# Altium footprint library HDR2.54.PcbLib: 242 footprints (part 13 of 16)
Each footprint in its own frame and in the unit in brackets; x right, y up, seen from the top. Pads: shape width x height; smd on the part's side, far side on the other; paste and mask are expansions set on the pad; w line width, h text height; cw(c..) or ccw(c..) is an arc to the next point about the centre after c.
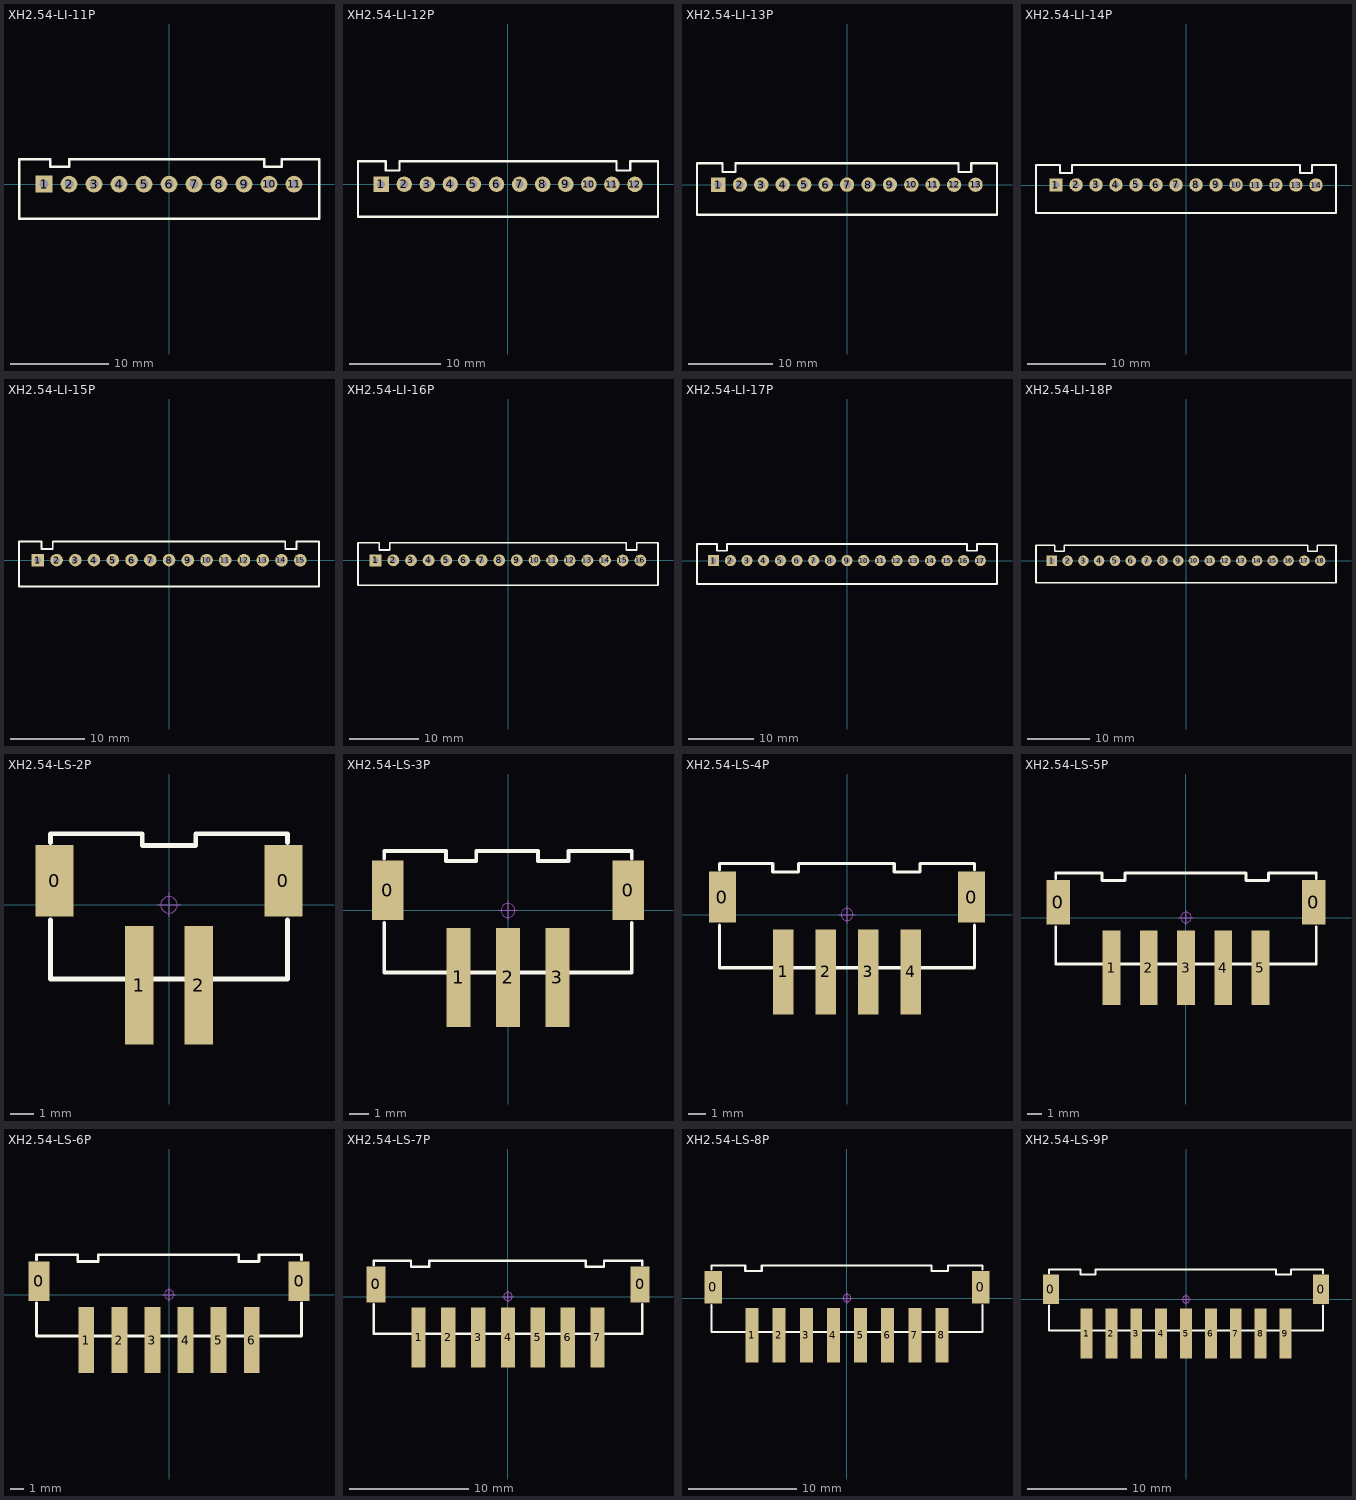
[diagram p12: the footprints below, top view; thin cyan lines are the x and y axes]

## XH2.54-LI-11P [mm] "�Ӳ����11P"
pads (11):
  rect 1.7x1.7 hole 0.9: 1(-12.7,0)
  round 1.7 hole 0.9: 2(-10.16,0) 3(-7.62,0) 4(-5.08,0) 5(-2.54,0) 6(0,0) 7(2.54,0) 8(5.08,0) 9(7.62,0) 10(10.16,0) 11(12.7,0)
Top Overlay:
  lines w0.254: -15.24,-3.5 -15.24,2.5 -12.065,2.5 -12.065,1.75 -10.16,1.75 -10.16,2.5 9.652,2.5 9.652,1.75 11.43,1.75 11.43,2.5 15.24,2.5 15.24,-3.5 -15.24,-3.5
3D body "XH2.54-11P.STEP": height 7.03, standoff -3.37, extent -15.2,-3.3 15.2,2.4

## XH2.54-LI-12P [mm] "�Ӳ����12P"
pads (12):
  rect 1.7x1.7 hole 0.9: 1(-13.97,-0.009)
  round 1.7 hole 0.9: 2(-11.417,0.003) 3(-8.877,0.003) 4(-6.35,0.009) 5(-3.797,0.003) 6(-1.257,0.003) 7(1.283,0.003) 8(3.823,0.003) 9(6.363,0.003) 10(8.903,0.003) 11(11.43,-0.009) 12(13.97,-0.009)
Top Overlay:
  lines w0.254: -16.506,-3.565 -16.506,-2.025 -16.506,2.531 -13.462,2.531 -13.462,1.515 -11.938,1.515 -11.938,2.531 11.938,2.531 11.938,1.515 13.462,1.515 13.462,2.531 16.51,2.531 16.51,-3.565 -16.506,-3.565
3D body "XH2.54-12P.STEP": height 7.05, standoff -2.45, extent -16.47,-3.309 16.47,2.391

## XH2.54-LI-13P [mm] "�Ӳ����13P"
pads (13):
  rect 1.7x1.7 hole 0.9: 1(-15.244,0)
  round 1.7 hole 0.9: 2(-12.692,0.013) 3(-10.152,0.013) 4(-7.624,0.019) 5(-5.072,0.013) 6(-2.532,0.013) 7(0.008,0.013) 8(2.548,0.013) 9(5.088,0.013) 10(7.628,0.013) 11(10.156,0) 12(12.696,0) 13(15.24,0)
Top Overlay:
  lines w0.254: -17.78,-3.556 -17.78,-2.016 -17.78,2.54 -14.736,2.54 -14.736,1.524 -13.212,1.524 -13.212,2.54 13.208,2.54 13.208,1.524 14.732,1.524 14.732,2.54 17.78,2.54 17.78,-3.556 -17.78,-3.556
3D body "XH2.54-13P.STEP": height 7.05, standoff -2.45, extent -17.74,-3.3 17.74,2.4

## XH2.54-LI-14P [mm] "�Ӳ����14P"
pads (14):
  rect 1.7x1.7 hole 0.9: 1(-16.514,0)
  round 1.7 hole 0.9: 2(-13.962,0.013) 3(-11.422,0.013) 4(-8.894,0.019) 5(-6.342,0.013) 6(-3.802,0.013) 7(-1.262,0.013) 8(1.278,0.013) 9(3.818,0.013) 10(6.358,0.013) 11(8.886,0) 12(11.426,0) 13(13.97,0) 14(16.51,0)
Top Overlay:
  lines w0.254: -19.05,-3.556 19.05,-3.556 19.05,2.54 16.002,2.54 16.002,1.524 14.478,1.524 14.478,2.54 -14.482,2.54 -14.482,1.524 -16.006,1.524 -16.006,2.54 -19.05,2.54 -19.05,-2.016 -19.05,-3.556
3D body "XH2.54-14P.STEP": height 7.05, standoff -2.45, extent -19.01,-3.3 19.01,2.4

## XH2.54-LI-15P [mm] "�Ӳ����15P"
pads (15):
  rect 1.7x1.7 hole 0.9: 1(-17.793,-0.013)
  round 1.7 hole 0.9: 2(-15.24,0) 3(-12.7,0) 4(-10.173,0.006) 5(-7.62,0) 6(-5.08,0) 7(-2.54,0) 8(0,0) 9(2.54,0) 10(5.08,0) 11(7.607,-0.013) 12(10.147,-0.013) 13(12.692,-0.013) 14(15.232,-0.013) 15(17.772,-0.013)
Top Overlay:
  lines w0.254: -20.328,-3.569 -20.328,-2.028 -20.328,2.527 -17.285,2.527 -17.285,1.511 -15.761,1.511 -15.761,2.527 15.74,2.527 15.74,1.511 17.264,1.511 17.264,2.527 20.312,2.527 20.312,-3.569 -20.328,-3.569
3D body "XH2.54-15P.STEP": height 7.05, standoff -2.45, extent -20.293,-3.313 20.267,2.387

## XH2.54-LI-16P [mm] "�Ӳ����16P"
pads (16):
  rect 1.7x1.7 hole 0.9: 1(-19.054,0)
  round 1.7 hole 0.9: 2(-16.502,0.013) 3(-13.962,0.013) 4(-11.434,0.019) 5(-8.882,0.013) 6(-6.342,0.013) 7(-3.802,0.013) 8(-1.262,0.013) 9(1.278,0.013) 10(3.818,0.013) 11(6.346,0) 12(8.886,0) 13(11.43,0) 14(13.97,0) 15(16.51,0) 16(19.05,0)
Top Overlay:
  lines w0.254: -21.59,-3.556 -21.59,-2.016 -21.59,2.54 -18.546,2.54 -18.546,1.524 -17.022,1.524 -17.022,2.54 17.018,2.54 17.018,1.524 18.542,1.524 18.542,2.54 21.59,2.54 21.59,-3.556 -21.59,-3.556
3D body "XH2.54-16P.STEP": height 7.05, standoff -2.45, extent -21.55,-3.3 21.55,2.4

## XH2.54-LI-17P [mm] "�Ӳ����17P"
pads (17):
  rect 1.7x1.7 hole 0.9: 1(-20.333,-0.013)
  round 1.7 hole 0.9: 2(-17.78,0) 3(-15.24,0) 4(-12.713,0.006) 5(-10.16,0) 6(-7.62,0) 7(-5.08,0) 8(-2.54,0) 9(0,0) 10(2.54,0) 11(5.067,-0.013) 12(7.607,-0.013) 13(10.152,-0.013) 14(12.692,-0.013) 15(15.232,-0.013) 16(17.772,-0.013) 17(20.312,-0.013)
Top Overlay:
  lines w0.254: -22.868,-3.569 22.852,-3.569 22.852,2.527 19.804,2.527 19.804,1.511 18.28,1.511 18.28,2.527 -18.301,2.527 -18.301,1.511 -19.825,1.511 -19.825,2.527 -22.868,2.527 -22.868,-2.028 -22.868,-3.569
3D body "XH2.54-17P.STEP": height 7.05, standoff -2.45, extent -22.82,-3.3 22.82,2.4

## XH2.54-LI-18P [mm] "�Ӳ����18P  �Ա�ID:�ƾ���ʯ   ������ַ:https://shop463601444.taobao.com"
pads (18):
  rect 1.7x1.7 hole 0.9: 1(-21.594,0)
  round 1.7 hole 0.9: 2(-19.042,0.013) 3(-16.502,0.013) 4(-13.974,0.019) 5(-11.422,0.013) 6(-8.882,0.013) 7(-6.342,0.013) 8(-3.802,0.013) 9(-1.262,0.013) 10(1.278,0.013) 11(3.806,0) 12(6.346,0) 13(8.89,0) 14(11.43,0) 15(13.97,0) 16(16.51,0) 17(19.05,0) 18(21.59,0)
Top Overlay:
  lines w0.254: -24.13,-3.556 24.13,-3.556 24.13,2.54 21.082,2.54 21.082,1.524 19.558,1.524 19.558,2.54 -19.562,2.54 -19.562,1.524 -21.086,1.524 -21.086,2.54 -24.13,2.54 -24.13,-2.016 -24.13,-3.556
3D body "XH2.54-18P.STEP": height 7.05, standoff -2.45, extent -24.09,-3.3 24.09,2.4

## XH2.54-LS-2P [mm] "����10mm�����6mm���ߣ�8.3mm    �Ա�ID:�ƾ���ʯ   ������ַ:https://shop463601444.taobao.com"
pads (4):
  rect 1.6x3 smd: 0(-4.826,1.016) 0(4.826,1.016)
  rect 1.2x5 smd: 1(-1.25,-3.383) 2(1.25,-3.383)
Top Overlay:
  lines w0.2: -5,-0.625 -5,-3.125 5,-3.125 5,-0.625 ; 5,2.625 5,3 1.125,3 1.125,2.5 -1.125,2.5 -1.125,3 -5,3 -5,2.625 ; -5,2.625 -5,2.625
Mechanical 15:
  circle w0.05: c0,0 r0.35
  lines w0.05: -0.5,0 0.5,0 ; 0,-0.5 0,0.5
3D body "XH2.54-LS-2P.STEP": height 8, standoff 0, extent -5,-6 5,3

## XH2.54-LS-3P [mm] "����12.5mm�����6mm���ߣ�8.3mm   �Ա�ID:�ƾ���ʯ   ������ַ:https://shop463601444.taobao.com"
pads (5):
  rect 1.6x3 smd: 0(-6.076,1.016) 0(6.076,1.016)
  rect 1.2x5 smd: 1(-2.5,-3.383) 2(0,-3.383) 3(2.5,-3.383)
Top Overlay:
  lines w0.2: -6.25,-0.625 -6.25,-3.125 6.25,-3.125 6.25,-0.625 ; -6.25,2.625 -6.25,3 -3.128,3 -3.128,2.5 -1.604,2.5 -1.604,3 1.524,3 1.524,2.5 3.048,2.5 3.048,3 6.25,3 6.25,2.625
Mechanical 15:
  circle w0.05: c0,0 r0.35
  lines w0.05: -0.5,0 0.5,0 ; 0,-0.5 0,0.5
3D body "XH2.54-LS-3P.STEP": height 8, standoff 0, extent -6.25,-6 6.25,3

## XH2.54-LS-4P [mm] "����15mm�����6mm���ߣ�8.3mm"
pads (6):
  rect 1.6x3 smd: 0(-7.326,1.016) 0(7.326,1.016)
  rect 1.2x5 smd: 1(-3.75,-3.383) 2(-1.25,-3.383) 3(1.25,-3.383) 4(3.75,-3.383)
Top Overlay:
  lines w0.2: -7.5,-0.625 -7.5,-3.125 7.5,-3.125 ; -7.5,2.625 -7.5,3 -4.378,3 -4.378,2.5 -2.854,2.5 -2.854,3 2.774,3 2.774,2.5 4.298,2.5 4.298,3 7.5,3 7.5,2.625 ; 7.5,-3.125 7.5,-0.625
Mechanical 15:
  circle w0.05: c0,0 r0.35
  lines w0.05: -0.5,0 0.5,0 ; 0,-0.5 0,0.5
3D body "XH2.54-LS-4P.STEP": height 8, standoff 0, extent -7.5,-6 7.5,3

## XH2.54-LS-5P [mm] "����17.5mm�����6mm���ߣ�8.3mm"
pads (7):
  rect 1.6x3 smd: 0(-8.576,1.016) 0(8.576,1.016)
  rect 1.2x5 smd: 1(-5,-3.383) 2(-2.5,-3.383) 3(0,-3.383) 4(2.5,-3.383) 5(5,-3.383)
Top Overlay:
  lines w0.2: -8.75,-0.625 -8.75,-3.125 8.75,-3.125 8.75,-0.625 ; -8.75,2.625 -8.75,3 -5.628,3 -5.628,2.5 -4.104,2.5 -4.104,3 4.024,3 4.024,2.5 5.548,2.5 5.548,3 8.75,3 8.75,2.625
Mechanical 15:
  circle w0.05: c0,0 r0.35
  lines w0.05: -0.5,0 0.5,0 ; 0,-0.5 0,0.5
3D body "XH2.54-LS-5P.STEP": height 8, standoff 0, extent -8.75,-6 8.75,3

## XH2.54-LS-6P [mm] "����20mm�����6mm���ߣ�8.3mm"
pads (8):
  rect 1.6x3 smd: 0(-9.826,1.016) 0(9.826,1.016)
  rect 1.2x5 smd: 1(-6.25,-3.433) 2(-3.75,-3.433) 3(-1.25,-3.433) 4(1.25,-3.433) 5(3.75,-3.433) 6(6.25,-3.433)
Top Overlay:
  lines w0.2: -10,-0.625 -10,-3.125 10,-3.125 10,-0.625 ; -10,2.625 -10,3 -6.878,3 -6.878,2.5 -5.354,2.5 -5.354,3 5.274,3 5.274,2.5 6.798,2.5 6.798,3 10,3 10,2.625
Mechanical 15:
  circle w0.05: c0,0 r0.35
  lines w0.05: -0.5,0 0.5,0 ; 0,-0.5 0,0.5
3D body "XH2.54-LS-6P.STEP": height 8, standoff 0, extent -10,-6 10,3

## XH2.54-LS-7P [mm] "����22.5mm�����6mm���ߣ�8.3mm"
pads (9):
  rect 1.6x3 smd: 0(-11.076,1.016) 0(11.076,1.016)
  rect 1.2x5 smd: 1(-7.5,-3.433) 2(-5,-3.433) 3(-2.5,-3.433) 4(0,-3.433) 5(2.5,-3.433) 6(5,-3.433) 7(7.5,-3.433)
Top Overlay:
  lines w0.2: -11.25,-0.625 -11.25,-3.125 11.25,-3.125 11.25,-0.625 ; -11.25,2.625 -11.25,3 -8.128,3 -8.128,2.5 -6.604,2.5 -6.604,3 6.524,3 6.524,2.5 8.048,2.5 8.048,3 11.25,3 11.25,2.625
Mechanical 15:
  circle w0.05: c0,0 r0.35
  lines w0.05: -0.5,0 0.5,0 ; 0,-0.5 0,0.5
3D body "XH2.54-LS-7P.STEP": height 8, standoff 0, extent -11.25,-6 11.25,3

## XH2.54-LS-8P [mm] "����25mm�����6mm���ߣ�8.3mm"
pads (10):
  rect 1.6x3 smd: 0(-12.326,1.016) 0(12.326,1.016)
  rect 1.2x5 smd: 1(-8.75,-3.433) 2(-6.25,-3.433) 3(-3.75,-3.433) 4(-1.25,-3.433) 5(1.25,-3.433) 6(3.75,-3.433) 7(6.25,-3.433) 8(8.75,-3.433)
Top Overlay:
  lines w0.2: -12.5,-0.625 -12.5,-3.125 12.5,-3.125 12.5,-0.625 ; -12.5,2.625 -12.5,3 -9.378,3 -9.378,2.5 -7.854,2.5 -7.854,3 7.774,3 7.774,2.5 9.298,2.5 9.298,3 12.5,3 12.5,2.625
Mechanical 15:
  circle w0.05: c0,0 r0.35
  lines w0.05: -0.5,0 0.5,0 ; 0,-0.5 0,0.5
3D body "XH2.54-LS-8P.STEP": height 8, standoff 0, extent -12.5,-6 12.5,3

## XH2.54-LS-9P [mm] "����27.5mm�����6mm���ߣ�8.3mm   �Ա�ID:�ƾ���ʯ   ������ַ:https://shop463601444.taobao.com"
pads (11):
  rect 1.6x3 smd: 0(-13.576,1.016) 0(13.576,1.016)
  rect 1.2x5 smd: 1(-10,-3.433) 2(-7.5,-3.433) 3(-5,-3.433) 4(-2.5,-3.433) 5(0,-3.433) 6(2.5,-3.433) 7(5,-3.433) 8(7.5,-3.433) 9(10,-3.433)
Top Overlay:
  lines w0.2: -13.75,-0.625 -13.75,-3.125 13.75,-3.125 13.75,-0.625 ; -13.75,2.625 -13.75,3 -10.628,3 -10.628,2.5 -9.104,2.5 -9.104,3 9.024,3 9.024,2.5 10.548,2.5 10.548,3 13.75,3 13.75,2.625
Mechanical 15:
  circle w0.05: c0,0 r0.35
  lines w0.05: -0.5,0 0.5,0 ; 0,-0.5 0,0.5
3D body "XH2.54-LS-9P.STEP": height 8, standoff 0, extent -13.75,-6 13.75,3